# Altium footprint library XTIDA-010086.PcbLib: 88 footprints (part 3 of 6)
Each footprint in its own frame and in the unit in brackets; x right, y up, seen from the top. Pads: shape width x height; smd on the part's side, far side on the other; paste and mask are expansions set on the pad; w line width, h text height; cw(c..) or ccw(c..) is an arc to the next point about the centre after c.
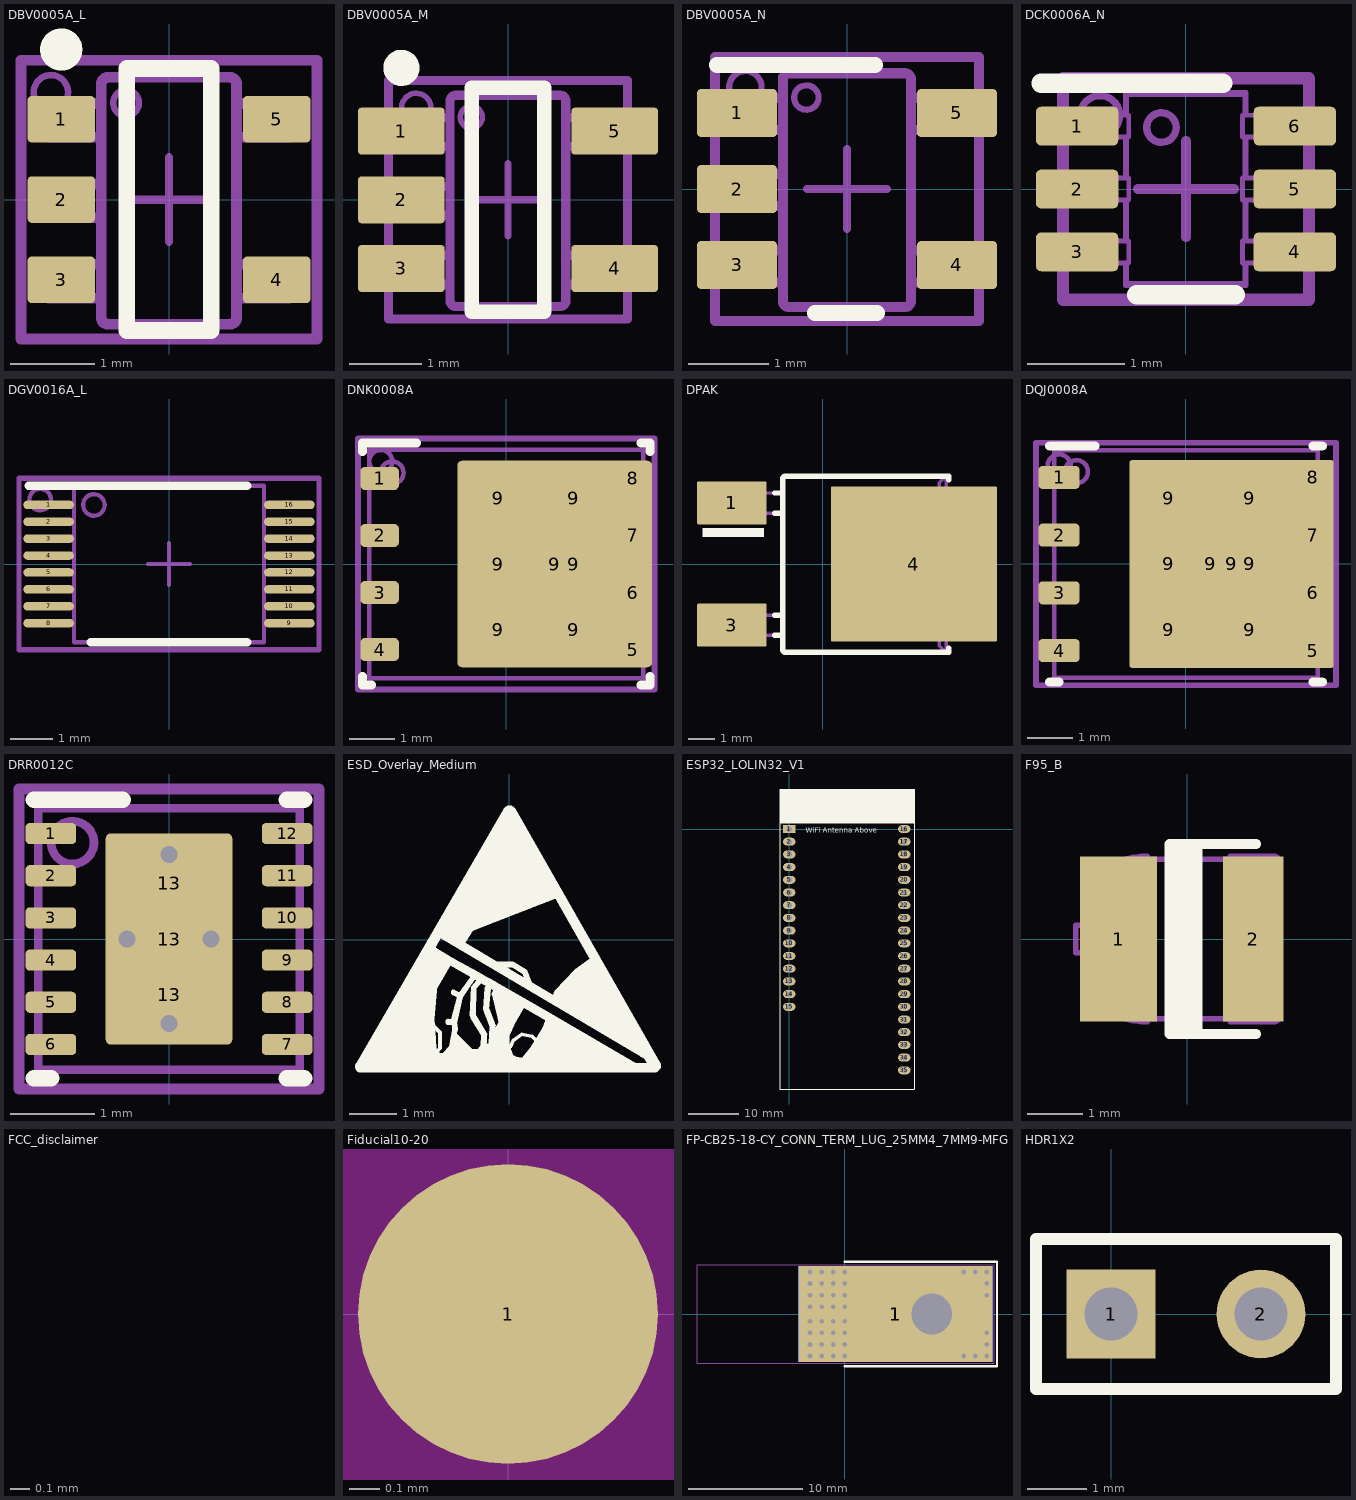
[diagram p2: the footprints below, top view; thin cyan lines are the x and y axes]

## DBV0005A_L [mm] "SOT23, 5-Leads, Body 3.05x1.75mm, Pitch 0.95mm, IPC High Density"
height 1.45
pads (5):
  rrect18% 0.8x0.55 smd: 1(-1.275,0.95) 2(-1.275,0) 3(-1.275,-0.95) 4(1.275,-0.95) 5(1.275,0.95)
Top Overlay:
  circle w0.25: c-1.275,1.775 r0.125
  lines w0.2: -0.5,-1.55 0.5,-1.55 0.5,1.55 -0.5,1.55 -0.5,-1.55
Mechanical 5:
  circle w0.076: c-1.397,1.27 r0.203
  lines w0.127: -1.75,-1.65 -1.75,1.65 1.75,1.65 1.75,-1.65 -1.75,-1.65
  text ".Designator" at 0.15,-2.249 h0.45
Mechanical 13:
  circle w0.076: c-0.508,1.143 r0.152
  lines w0.127: -0.801,1.371 cw(c-0.725,1.37) -0.725,1.446 ; -0.801,1.37 -0.801,1.371 ; -0.801,1.37 -0.801,-1.399 -0.801,-1.4 ccw(c-0.725,-1.399) -0.725,-1.475 ; -0.725,-1.475 -0.725,-1.475 ; -0.725,-1.475 0.723,-1.475 0.724,-1.475 ccw(c0.723,-1.399) 0.799,-1.4 0.799,-1.399 0.799,1.37 ; -0.725,1.446 -0.725,1.446 ; -0.725,1.446 0.723,1.446 0.724,1.446 cw(c0.723,1.37) 0.799,1.371 ; 0.799,1.37 0.799,1.371 ; -1.423,-1.167 -1.199,-1.167 -1.105,-1.167 -1.089,-1.167 -0.835,-1.167 -0.801,-1.167 -0.801,-0.767 -0.835,-0.767 -1.088,-0.767 -1.105,-0.767 -1.199,-0.767 -1.423,-0.767 -1.423,-1.167 ; -1.423,-0.215 -1.199,-0.215 -1.105,-0.215 -1.089,-0.215 -0.835,-0.215 -0.801,-0.215 -0.801,0.186 -0.835,0.186 -1.088,0.186 -1.105,0.186 -1.199,0.186 -1.423,0.186 -1.423,-0.215 ; -1.423,0.738 -1.199,0.738 -1.105,0.738 -1.088,0.738 -0.835,0.738 -0.801,0.738 -0.801,1.138 -0.835,1.138 -1.088,1.138 -1.105,1.138 -1.199,1.138 -1.423,1.138 -1.423,0.738 ; 0.799,-1.167 0.834,-1.167 1.087,-1.167 1.103,-1.167 1.198,-1.167 1.422,-1.167 1.422,-0.767 1.198,-0.767 1.103,-0.767 1.087,-0.767 0.834,-0.767 0.799,-0.767 0.799,-1.167 ; 0.799,0.738 0.834,0.738 1.087,0.738 1.103,0.738 1.198,0.738 1.422,0.738 1.422,1.138 1.198,1.138 1.103,1.138 1.087,1.138 0.834,1.138 0.799,1.138 0.799,0.738
Mechanical 15:
  lines w0.1: -0.5,0 0.5,0 ; 0,-0.5 0,0.5
3D body "DBV0005AaksMF05A.stp": height 1.08, standoff -0.01, extent -1.422,-1.461 1.422,1.46

## DBV0005A_M [mm] "SOT23, 5-Leads, Body 3.05x1.75mm, Pitch 0.95mm, IPC Low Density"
height 1.45
pads (5):
  rrect15% 1.2x0.65 smd: 1(-1.475,0.95) 2(-1.475,0) 3(-1.475,-0.95) 4(1.475,-0.95) 5(1.475,0.95)
Top Overlay:
  circle w0.25: c-1.475,1.825 r0.125
  lines w0.2: -0.5,-1.55 0.5,-1.55 0.5,1.55 -0.5,1.55 -0.5,-1.55
Mechanical 5:
  circle w0.076: c-1.27,1.27 r0.203
  lines w0.127: -1.651,-1.651 1.651,-1.651 1.651,1.651 -1.651,1.651 -1.651,-1.651
  text ".Designator" at 0.15,-2.249 h0.45
Mechanical 13:
  circle w0.076: c-0.508,1.143 r0.152
  lines w0.127: -0.801,1.371 cw(c-0.725,1.37) -0.725,1.446 ; -0.801,1.37 -0.801,-1.399 -0.801,-1.4 ccw(c-0.725,-1.399) -0.725,-1.475 ; -0.801,1.37 -0.801,1.371 ; -0.725,-1.475 0.723,-1.475 0.724,-1.475 ccw(c0.723,-1.399) 0.799,-1.4 0.799,-1.399 0.799,1.37 ; -0.725,-1.475 -0.725,-1.475 ; -0.725,1.446 0.723,1.446 0.724,1.446 cw(c0.723,1.37) 0.799,1.371 ; -0.725,1.446 -0.725,1.446 ; 0.799,1.37 0.799,1.371 ; -1.423,-1.167 -1.423,-0.767 -1.199,-0.767 -1.105,-0.767 -1.088,-0.767 -0.835,-0.767 -0.801,-0.767 -0.801,-1.167 -0.835,-1.167 -1.089,-1.167 -1.105,-1.167 -1.199,-1.167 -1.423,-1.167 ; -1.423,-0.215 -1.423,0.186 -1.199,0.186 -1.105,0.186 -1.088,0.186 -0.835,0.186 -0.801,0.186 -0.801,-0.215 -0.835,-0.215 -1.089,-0.215 -1.105,-0.215 -1.199,-0.215 -1.423,-0.215 ; -1.423,0.738 -1.423,1.138 -1.199,1.138 -1.105,1.138 -1.088,1.138 -0.835,1.138 -0.801,1.138 -0.801,0.738 -0.835,0.738 -1.088,0.738 -1.105,0.738 -1.199,0.738 -1.423,0.738 ; 0.799,-1.167 0.799,-0.767 0.834,-0.767 1.087,-0.767 1.103,-0.767 1.198,-0.767 1.422,-0.767 1.422,-1.167 1.198,-1.167 1.103,-1.167 1.087,-1.167 0.834,-1.167 0.799,-1.167 ; 0.799,0.738 0.799,1.138 0.834,1.138 1.087,1.138 1.103,1.138 1.198,1.138 1.422,1.138 1.422,0.738 1.198,0.738 1.103,0.738 1.087,0.738 0.834,0.738 0.799,0.738
Mechanical 15:
  lines w0.1: -0.5,0 0.5,0 ; 0,-0.5 0,0.5
3D body "DBV0005AaksMF05A.stp": height 1.08, standoff -0.01, extent -1.422,-1.461 1.422,1.46

## DBV0005A_N [mm] "SOT23, 5-Leads, Body 2.9x1.6mm, Pitch 0.95mm, Lead Span 2.8mm, IPC Medium Density"
height 1.45
pads (5):
  rrect17% 1x0.6 smd: 1(-1.375,0.95) 2(-1.375,0) 3(-1.375,-0.95) 4(1.375,-0.95) 5(1.375,0.95)
Top Overlay:
  lines w0.2: -1.625,1.55 0.35,1.55 ; -0.4,-1.55 0.375,-1.55
Mechanical 5:
  circle w0.076: c-1.27,1.27 r0.203
  lines w0.127: -1.651,-1.651 -1.651,1.651 1.651,1.651 1.651,-1.651 -1.651,-1.651
  text ".Designator" at 0.15,-2.249 h0.45
Mechanical 13:
  circle w0.076: c-0.508,1.143 r0.152
  lines w0.127: -0.801,1.371 cw(c-0.725,1.37) -0.725,1.446 ; -0.801,1.37 -0.801,-1.399 -0.801,-1.4 ccw(c-0.725,-1.399) -0.725,-1.475 ; -0.801,1.37 -0.801,1.371 ; -0.725,-1.475 -0.725,-1.475 ; -0.725,-1.475 0.723,-1.475 0.724,-1.475 ccw(c0.723,-1.399) 0.799,-1.4 0.799,-1.399 0.799,1.37 ; -0.725,1.446 -0.725,1.446 ; -0.725,1.446 0.723,1.446 0.724,1.446 cw(c0.723,1.37) 0.799,1.371 ; 0.799,1.37 0.799,1.371 ; -1.423,-1.167 -1.199,-1.167 -1.105,-1.167 -1.088,-1.167 -0.835,-1.167 -0.801,-1.167 -0.801,-0.767 -0.835,-0.767 -1.088,-0.767 -1.105,-0.767 -1.199,-0.767 -1.423,-0.767 -1.423,-1.167 ; -1.423,-0.215 -1.199,-0.215 -1.105,-0.215 -1.088,-0.215 -0.835,-0.215 -0.801,-0.215 -0.801,0.186 -0.835,0.186 -1.088,0.186 -1.105,0.186 -1.199,0.186 -1.423,0.186 -1.423,-0.215 ; -1.423,0.738 -1.199,0.738 -1.105,0.738 -1.088,0.738 -0.835,0.738 -0.801,0.738 -0.801,1.138 -0.835,1.138 -1.088,1.138 -1.105,1.138 -1.199,1.138 -1.423,1.138 -1.423,0.738 ; 0.799,-1.167 0.834,-1.167 1.087,-1.167 1.103,-1.167 1.198,-1.167 1.422,-1.167 1.422,-0.767 1.198,-0.767 1.103,-0.767 1.087,-0.767 0.834,-0.767 0.799,-0.767 0.799,-1.167 ; 0.799,0.738 0.834,0.738 1.087,0.738 1.103,0.738 1.198,0.738 1.422,0.738 1.422,1.138 1.198,1.138 1.103,1.138 1.087,1.138 0.834,1.138 0.799,1.138 0.799,0.738
Mechanical 15:
  lines w0.1: -0.5,0 0.5,0 ; 0,-0.5 0,0.5
3D body "DBV0005A.stp": height 1.09, standoff 0, extent -1.422,-1.461 1.423,1.46

## DCK0006A_N [mm] "SOT23, 6-Leads, Body 2x1.3mm, Pitch 0.65mm, Lead Span 2.1mm, IPC Medium Density"
height 1.1
pads (6):
  rrect25% 0.85x0.4 smd: 1(-1.125,0.65) 2(-1.125,0) 3(-1.125,-0.65) 4(1.125,-0.65) 5(1.125,0) 6(1.125,0.65)
Top Overlay:
  lines w0.2: -1.499,1.092 0.381,1.092 ; -0.508,-1.092 0.508,-1.092
Mechanical 5:
  circle w0.076: c-0.889,0.762 r0.203
  lines w0.127: -1.27,-1.143 1.27,-1.143 1.27,1.143 -1.27,1.143 -1.27,-1.143
  text ".Designator" at 0.15,-2.249 h0.45
Mechanical 13:
  circle w0.076: c-0.254,0.635 r0.152
  lines w0.05: -0.613,-0.763 -0.613,-0.976 0.607,-0.976 0.607,-0.763 ; -0.613,-0.538 -0.613,-0.113 ; -0.613,0.112 -0.613,0.537 ; -0.613,0.762 -0.613,0.974 0.607,0.974 0.607,0.762 ; 0.607,-0.538 0.607,-0.113 ; 0.607,0.112 0.607,0.537 ; -0.628,-0.763 -0.628,-1.001 0.622,-1.001 0.622,-0.763 ; -0.628,-0.763 -0.853,-0.763 -0.865,-0.763 -0.959,-0.763 -1.143,-0.763 -1.143,-0.538 -0.959,-0.538 -0.865,-0.538 -0.853,-0.538 -0.628,-0.538 ; -0.628,-0.763 -0.591,-0.763 -0.591,-0.538 -0.628,-0.538 ; -0.628,-0.538 -0.628,-0.113 ; -0.628,-0.113 -0.853,-0.113 -0.865,-0.113 -0.959,-0.113 -1.143,-0.113 -1.143,0.112 -0.959,0.112 -0.865,0.112 -0.853,0.112 -0.628,0.112 ; -0.628,-0.113 -0.591,-0.113 -0.591,0.112 -0.628,0.112 ; -0.628,0.112 -0.628,0.537 ; -0.628,0.537 -0.853,0.537 -0.865,0.537 -0.959,0.537 -1.143,0.537 -1.143,0.762 -0.959,0.762 -0.865,0.762 -0.853,0.762 -0.628,0.762 ; -0.628,0.537 -0.591,0.537 -0.591,0.762 -0.628,0.762 ; -0.628,0.762 -0.628,0.999 0.622,0.999 0.622,0.762 ; 0.622,-0.763 0.847,-0.763 0.859,-0.763 0.953,-0.763 1.137,-0.763 1.137,-0.538 0.953,-0.538 0.859,-0.538 0.847,-0.538 0.622,-0.538 ; 0.622,-0.763 0.585,-0.763 0.585,-0.538 0.622,-0.538 ; 0.622,-0.538 0.622,-0.113 ; 0.622,-0.113 0.585,-0.113 0.585,0.112 0.622,0.112 ; 0.622,-0.113 0.847,-0.113 0.859,-0.113 0.953,-0.113 1.137,-0.113 1.137,0.112 0.953,0.112 0.859,0.112 0.847,0.112 0.622,0.112 ; 0.622,0.112 0.622,0.537 ; 0.622,0.537 0.847,0.537 0.859,0.537 0.953,0.537 1.137,0.537 1.137,0.762 0.953,0.762 0.859,0.762 0.847,0.762 0.622,0.762 ; 0.622,0.537 0.585,0.537 0.585,0.762 0.622,0.762
Mechanical 15:
  lines w0.1: -0.5,0 0.5,0 ; 0,-0.5 0,0.5
3D body "DCK0006A.stp": height 0.95, standoff 0, extent -1.14,-1 1.14,1

## DGV0016A_L [mm] "TSSOP, 16-Leads, Body 3.6x4.4mm, Pitch 0.4mm, IPC High Density"
height 1.2
pads (16):
  oval 1.2x0.2 smd: 1(-2.85,1.4) 2(-2.85,1) 3(-2.85,0.6) 4(-2.85,0.2) 5(-2.85,-0.2) 6(-2.85,-0.6) 7(-2.85,-1) 8(-2.85,-1.4) 9(2.85,-1.4) 10(2.85,-1) 11(2.85,-0.6) 12(2.85,-0.2) 13(2.85,0.2) 14(2.85,0.6) 15(2.85,1) 16(2.85,1.4)
Top Overlay:
  lines w0.2: -3.325,1.85 1.85,1.85 ; -1.85,-1.85 1.85,-1.85
Mechanical 5:
  circle w0.102: c-3.048,1.524 r0.254
  lines w0.127: -3.55,-2.032 -3.55,2.032 3.55,2.032 3.55,-2.032 -3.55,-2.032
  text ".Designator" at -3.749,-0.25 h0.75
Mechanical 13:
  circle w0.102: c-1.778,1.397 r0.254
  lines w0.1: -2.25,-1.85 2.25,-1.85 2.25,1.85 -2.25,1.85 -2.25,-1.85
Mechanical 15:
  lines w0.1: -0.5,0 0.5,0 ; 0,-0.5 0,0.5
3D body "DGV0016A.stp": height 1.2, standoff 0, extent -3.209,-1.8 3.209,1.8

## DNK0008A [mm] "SON, 8-Leads, Body 5x6mm"
height 1.05
pads (15):
  rrect39% 0.86x0.51 smd paste-0.05 mask-0.05: 1(-2.82,1.905) 2(-2.82,0.635) 3(-2.82,-0.635) 4(-2.82,-1.905) 5(2.82,-1.905) 6(2.82,-0.635) 7(2.82,0.635) 8(2.82,1.905)
  rrect50% 1.48x1.27 on Top Paste: 9(-0.18,-1.47) 9(-0.18,0) 9(-0.18,1.47) 9(1.5,-1.47) 9(1.5,0) 9(1.5,1.47)
  rrect5% 4.34x4.6 smd paste-3 mask-0.05: 9(1.08,0)
Top Overlay:
  lines w0.2: -3.2,-2.5 -3.2,-2.7 -3,-2.7 ; -3.2,2.5 -3.2,2.7 -2,2.7 ; 3,-2.7 3.2,-2.7 3.2,-2.5 ; 3,2.7 3.2,2.7 3.2,2.5
Mechanical 5:
  circle w0.102: c-2.794,2.286 r0.254
  lines w0.127: -3.302,-2.794 3.302,-2.794 3.302,2.794 -3.302,2.794 -3.302,-2.794
  text ".Designator" at -3.749,-0.25 h0.75
Mechanical 13:
  circle w0.102: c-2.54,2.032 r0.254
  lines w0.1: -3.05,-2.55 -3.05,2.55 3.05,2.55 3.05,-2.55 -3.05,-2.55
3D body: height 1.05, standoff 0, extent -3.05,-2.55 3.05,2.55

## DPAK [mm] "D-PAK, 3-Pads, Body 6.22x6.73mm (max), TO-252AA using nominal STEP model"
height 2.39
pads (3):
  rrect6% 2.6x1.6 smd: 1(-3.4,2.28) 3(-3.4,-2.28)
  rrect2% 6.2x5.8 smd paste-2.9: 4(3.4,0)
Top Overlay:
  rectangle: -4.5,1 -2.2,1.35
  lines w0.2: -1.8,1.9 -1.5,1.9 ; -1.8,2.65 -1.5,2.65 ; 4.7,-3.3 -1.429,-3.3 -1.5,-3.229 -1.5,-3.157 -1.5,-2.665 ; 4.7,-3.28 4.7,-3.15 ; 4.7,3.15 4.7,3.28 -1.429,3.28 -1.5,3.209 -1.5,3.137 -1.5,-1.915 ; -1.8,-2.665 -1.5,-2.665 ; -1.8,-2.665 -1.5,-2.665 ; -1.8,-2.665 -1.5,-2.665 ; -1.8,-1.915 -1.5,-1.915 ; -1.8,-1.915 -1.5,-1.915 ; -1.8,-1.915 -1.5,-1.915 ; -1.5,-2.665 -1.5,-1.915 ; -1.5,-2.665 -1.5,-1.915 ; -1.5,-2.665 -1.5,-1.915
Top Paste:
  rectangle: 0.4,1.625 1.675,2.8
  rectangle: 1.975,1.625 3.25,2.8
  rectangle: 3.55,1.625 4.825,2.8
  rectangle: 5.125,1.625 6.4,2.8
  rectangle: 0.4,0.15 1.675,1.325
  rectangle: 1.975,0.15 3.25,1.325
  rectangle: 3.55,0.15 4.825,1.325
  rectangle: 5.125,0.15 6.4,1.325
  rectangle: 0.4,-1.325 1.675,-0.15
  rectangle: 1.975,-1.325 3.25,-0.15
  rectangle: 3.55,-1.325 4.825,-0.15
  rectangle: 5.125,-1.325 6.4,-0.15
  rectangle: 5.125,-2.8 6.4,-1.625
  rectangle: 3.55,-2.8 4.825,-1.625
  rectangle: 1.975,-2.8 3.25,-1.625
  rectangle: 0.4,-2.8 1.675,-1.625
Mechanical 5:
  lines w0.127: -1.5,1.9 -2.757,1.9 -3.157,1.9 ; -1.5,2.65 -2.757,2.65 -3.157,2.65 ; -3.899,-2.665 -3.357,-2.665 ; -3.899,-2.665 -3.899,-1.915 ; -3.899,-2.665 -3.357,-2.665 ; -3.899,-2.665 -3.899,-1.915 ; -3.899,-2.665 -3.357,-2.665 ; -3.899,-2.665 -3.899,-1.915 ; -3.899,-1.915 -3.357,-1.915 ; -3.899,-1.915 -3.357,-1.915 ; -3.899,-1.915 -3.357,-1.915 ; -3.357,-2.665 -3.157,-2.665 ; -3.357,-2.665 -3.157,-2.665 ; -3.357,-2.665 -3.157,-2.665 ; -3.357,-1.915 -3.157,-1.915 ; -3.357,-1.915 -3.157,-1.915 ; -3.357,-1.915 -3.157,-1.915 ; -3.157,-2.665 -3.157,-1.915 ; -3.157,-2.665 -2.757,-2.665 ; -3.157,-2.665 -3.157,-1.915 ; -3.157,-2.665 -2.757,-2.665 ; -3.157,-2.665 -3.157,-1.915 ; -3.157,-2.665 -2.757,-2.665 ; -3.157,-1.915 -2.757,-1.915 ; -3.157,-1.915 -2.757,-1.915 ; -3.157,-1.915 -2.757,-1.915 ; -3.157,1.9 -3.357,1.9 -3.899,1.9 -3.899,2.65 -3.357,2.65 -3.157,2.65 ; -3.157,1.9 -3.157,2.65 ; -2.757,-2.665 -1.5,-2.665 ; -2.757,-2.665 -1.5,-2.665 ; -2.757,-2.665 -1.5,-2.665 ; -2.757,-1.915 -1.5,-1.915 ; -2.757,-1.915 -1.5,-1.915 ; -2.757,-1.915 -1.5,-1.915 ; -1.5,-2.665 -1.5,-1.915 ; -1.5,-2.665 -1.5,-1.915 ; -1.5,-2.665 -1.5,-1.915 ; -1.5,-2.665 -1.5,-3.157 -1.5,-3.229 -1.429,-3.3 4.6,-3.3 ; -1.5,-1.915 -1.5,3.137 -1.5,3.209 -1.429,3.28 4.6,3.28 ; 4.6,-3.3 4.6,-2.69 5.8,-2.69 5.8,-2.01 5.308,-2.01 5.308,1.99 5.8,1.99 5.8,2.67 4.6,2.67 4.6,3.28 ; 4.6,-3.3 4.348,-3.048 4.348,3.028 4.6,3.28
  text ".Designator" at -3.601,-0.333 h1
3D body "td03b.stp": height 2.48, standoff 0.01, extent -3.856,-3.29 5.843,3.29

## DQJ0008A [mm] "SMD, 8-Leads, Body 5.75x4.9mm"
height 1.1
pads (16):
  rrect39% 0.91x0.51 smd paste-0.05 mask-0.05: 1(-2.795,1.905) 2(-2.795,0.635) 3(-2.795,-0.635) 4(-2.795,-1.905) 5(2.795,-1.905) 6(2.795,-0.635) 7(2.795,0.635) 8(2.795,1.905)
  rrect50% 1.58x1.25 on Top Paste: 9(-0.38,-1.45) 9(-0.38,0) 9(-0.38,1.45) 9(1.4,-1.45) 9(1.4,0) 9(1.4,1.45)
  rrect50% 3.48x4.47 on Top Solder: 9(0.55,0)
  rrect2% 4.49x4.57 smd paste-2.5 mask-2.5: 9(1.005,0)
Top Overlay:
  lines w0.2: -3,-2.6 -2.8,-2.6 ; -3,2.6 -2,2.6 ; 2.8,-2.6 3,-2.6 ; 2.8,2.6 3,2.6
Top Solder:
  rectangle: 2.25,-0.84 2.475,-0.43
  rectangle: 2.25,-2.11 2.475,-1.7
  rectangle: 2.25,1.7 2.475,2.11
  rectangle: 2.25,0.43 2.475,0.84
Mechanical 5:
  circle w0.102: c-2.794,2.159 r0.254
  lines w0.127: -3.302,-2.667 3.302,-2.667 3.302,2.667 -3.302,2.667 -3.302,-2.667
  text ".Designator" at -3.749,-0.25 h0.75
Mechanical 13:
  circle w0.102: c-2.413,2.032 r0.254
  lines w0.1: -2.9,-2.5 2.9,-2.5 2.9,2.5 -2.9,2.5 -2.9,-2.5
3D body "DQJ0008A.stp": height 1.15, standoff 0, extent -3.13,-2.45 3.13,2.45

## DRR0012C [mm] "SON, 12-Leads, Body 3x3mm, Pitch 0.5mm, Thermal Pad 1.5x2.5mm"
height 0.8
pads (15):
  rrect40% 0.6x0.25 smd: 1(-1.4,1.25) 2(-1.4,0.75) 3(-1.4,0.25) 4(-1.4,-0.25) 5(-1.4,-0.75) 6(-1.4,-1.25) 7(1.4,-1.25) 8(1.4,-0.75) 9(1.4,-0.25) 10(1.4,0.25) 11(1.4,0.75) 12(1.4,1.25)
  rrect50% 1.38x1.11 on Top Paste: 13(0,-0.66) 13(0,0.66)
  rrect7% 1.5x2.5 smd paste-1.7: 13(0,0)
via -0.5,0 diameter 0.5 hole 0.2
via 0,-1 diameter 0.5 hole 0.2
via 0.5,0 diameter 0.5 hole 0.2
via 0,1 diameter 0.5 hole 0.2
Top Overlay:
  lines w0.2: -1.6,-1.65 -1.4,-1.65 ; -1.6,1.65 -0.55,1.65 ; 1.4,-1.65 1.6,-1.65 ; 1.4,1.65 1.6,1.65
Mechanical 5:
  circle w0.102: c-1.143,1.143 r0.254
  lines w0.127: -1.778,-1.778 1.778,-1.778 1.778,1.778 -1.778,1.778 -1.778,-1.778
  text ".Designator" at -2.999,-0.2 h0.6
Mechanical 13:
  circle w0.102: c-1.143,1.143 r0.254
  lines w0.1: -1.55,-1.55 1.55,-1.55 1.55,1.55 -1.55,1.55 -1.55,-1.55
3D body: height 0.8, standoff 0, extent -1.55,-1.55 1.55,1.55

## ESD_Overlay_Medium [mm]
height 19.05
Top Overlay:
  drawing of 6916 lines, arcs and shapes, not listed

## ESP32_LOLIN32_V1 [mm] "WeMos LOLIN32 ESP32 Module"
height 0.6
pads (36):
  rect 2.5x1.6 / inner rect 2x1.2 / far side rect 2x1 hole 1.1: 1(0,0)
  oval 2.5x1.6 / inner oval 2x1.2 / far side oval 2x1 hole 1.1: 2(0,-2.54) 3(0,-5.08) 4(0,-7.62) 5(0,-10.16) 6(0,-12.7) 7(0,-15.24) 8(0,-17.78) 9(0,-20.32) 10(0,-22.86) 11(0,-25.4) 12(0,-27.94) 13(0,-30.48) 14(0,-33.02) 15(0,-35.56) 16(23,0) 17(23,-2.54) 17(23,-2.54) 18(23,-5.08) 19(23,-7.62) 20(23,-10.16) 21(23,-12.7) 22(23,-15.24) 23(23,-17.78) 24(23,-20.32) 25(23,-22.86) 26(23,-25.4) 27(23,-27.94) 28(23,-30.48) 29(23,-33.02) 30(23,-35.56) 31(23,-38.1) 32(23,-40.64) 33(23,-43.18) 34(23,-45.72) 35(23,-48.26)
Top Overlay:
  rectangle: -1.9,1.1 25,8
  lines w0.2: -1.9,-52 25,-52 25,8 -1.9,8 -1.9,-52
  text "WiFi Antenna Above" at 3.3,-0.7 h1
3D body "Lolin32 V1.0.0.step": height 8.35, standoff -7.64, extent -1.34,-51.186 24.2,7.586

## F95_B [mm] "AVX F95 series, size B"
height 2
pads (2):
  rect 1.4x3 smd: 1(-1.25,0)
  rect 1.1x3 smd: 2(1.2,0)
Top Overlay:
  rectangle: -0.275,-1.65 0.275,1.65
  lines w0.178: 1.25,-1.725 -0.325,-1.725 -0.325,1.725 1.25,1.725
Mechanical 5:
  lines w0.1: -1.825,-0.254 -2.025,-0.254 -2.025,0.254 -1.825,0.254 ; -0.725,-1.5 -0.825,-1.5 cw(c-0.825,-0.5) -1.825,-0.5 -1.825,0.5 cw(c-0.825,0.5) -0.825,1.5 -0.725,1.5 ; -0.725,-1.45 0.775,-1.45 ; -0.725,1.45 0.775,1.45 ; 0.775,-1.5 1.575,-1.5 ccw(c1.575,-1.4) 1.675,-1.4 1.675,1.4 ccw(c1.575,1.4) 1.575,1.5 0.775,1.5
  text ".Designator" at -2.999,-0.2 h0.6
3D body "F95_B.stp": height 2, standoff 0, extent -2.025,-1.5 1.675,1.5

## FCC_disclaimer [mm]
height 19.05
Top Overlay:
  text "For evaluation only; not FCC approved for resale." at 161.702,67.705 h1.52

## Fiducial10-20 [mm]
height 1.75
pads (1):
  round 1 smd mask+0.5: 1(0,0)
Top Layer keep-out:
  circle w1.178: c0,0 r0.5

## FP-CB25-18-CY_CONN_TERM_LUG_25MM4_7MM9-MFG [mil]
height 68.9
pads (2):
  rrect1% 670x330 smd paste+0 mask+0: 1(175,0)
  rrect1% 670x330 smd far side paste-39370.1 mask+0: 1(175,0)
via 490,-65 diameter 32 hole 16
via 490,-105 diameter 32 hole 16
via 490,65 diameter 32 hole 16
via 490,105 diameter 32 hole 16
via 410,145 diameter 32 hole 16
via 450,145 diameter 32 hole 16
via 490,145 diameter 32 hole 16
via 410,-145 diameter 32 hole 16
via 450,-145 diameter 32 hole 16
via 490,-145 diameter 32 hole 16
via 0,-145 diameter 32 hole 16
via -40,-145 diameter 32 hole 16
via -80,-145 diameter 32 hole 16
via -120,-145 diameter 32 hole 16
via 0,-105 diameter 32 hole 16
via -40,-105 diameter 32 hole 16
via -80,-105 diameter 32 hole 16
via -120,-105 diameter 32 hole 16
via 0,-65 diameter 32 hole 16
via -40,-65 diameter 32 hole 16
via -80,-65 diameter 32 hole 16
via -120,-65 diameter 32 hole 16
via 0,-25 diameter 32 hole 16
via -40,-25 diameter 32 hole 16
via -80,-25 diameter 32 hole 16
via -120,-25 diameter 32 hole 16
via 0,25 diameter 32 hole 16
via -40,25 diameter 32 hole 16
via -80,25 diameter 32 hole 16
via -120,25 diameter 32 hole 16
via 0,65 diameter 32 hole 16
via -40,65 diameter 32 hole 16
via -80,65 diameter 32 hole 16
via -120,65 diameter 32 hole 16
via 0,105 diameter 32 hole 16
via -40,105 diameter 32 hole 16
via -80,105 diameter 32 hole 16
via -120,105 diameter 32 hole 16
via 0,145 diameter 32 hole 16
via -40,145 diameter 32 hole 16
via -80,145 diameter 32 hole 16
via -120,145 diameter 32 hole 16
via 300,0 diameter 214.57 hole 140
Top Overlay:
  lines w7.87: 0,-179.76 524.76,-179.76 524.76,179.76 0,179.76
Mechanical 5:
  lines w3.94: -510,-170 -510,170 515,170 515,-170 -510,-170
  text ".Designator" at 70.79,295.61 h59.06
3D body "Conn_CB25-18-CY_CONN_TERM_LUG_25MM4_7MM9.STEP": height 10, standoff 0, extent -163.94,-168.94 513.94,168.94

## HDR1X2 [mm] "Connector; Header; 2 Position"
height 0.6
pads (2):
  rect 1.5x1.5 hole 0.9: 1(0,0)
  round 1.5 hole 0.9: 2(2.54,0)
Top Overlay:
  lines w0.2: -1.27,-1.27 -1.27,1.27 3.81,1.27 3.81,-1.27 -1.27,-1.27